# Altium schematic symbol library FPGA_Xilinx_Virtex7.SchLib: 34 symbols (part 15 of 34)
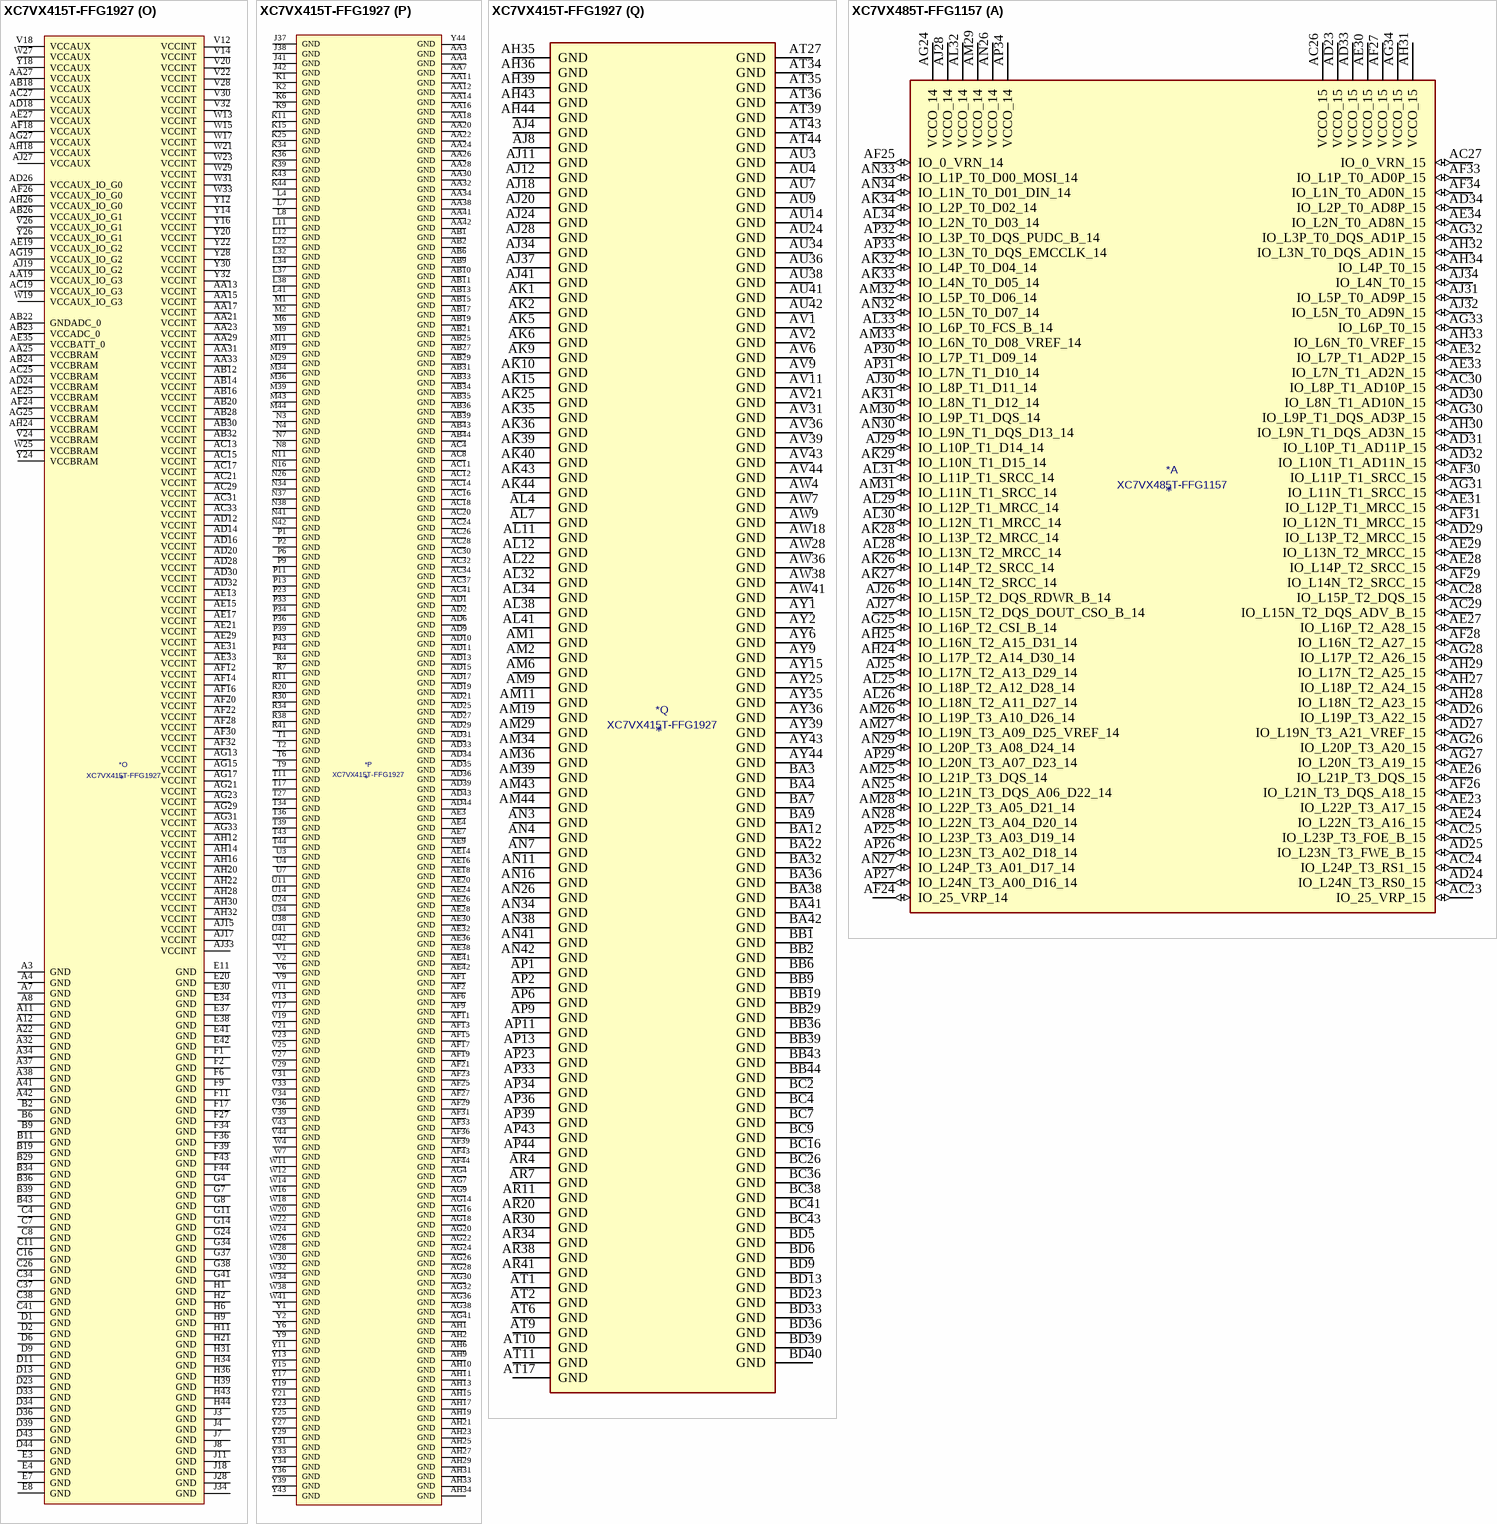
[diagram p186: symbols XC7VX415T-FFG1927 to XC7VX485T-FFG1157]

## XC7VX415T-FFG1927
designator *  value XC7VX415T-FFG1927
ki_keywords: FPGA; ki_description: Virtex 7 XT 415 XC7VX415T-FFG1927
part A pins: AJ23 VCCO_15 (power), AJ25 IO_L24P_T3_RS1_15 (io), AJ26 IO_L24N_T3_RS0_15 (io), AJ29 IO_L23P_T3_A03_D19_14 (io), AK23 IO_L21P_T3_DQS_15 (io), AK24 IO_L21N_T3_DQS_A18_15 (io), AK26 IO_L22P_T3_A17_15 (io), AK27 IO_L21P_T3_DQS_14 (io), AK28 IO_L21N_T3_DQS_A06_D22_14 (io), AK29 IO_L23N_T3_A02_D18_14 (io), AL23 IO_L19P_T3_A22_15 (io), AL24 IO_L23P_T3_FOE_B_15 (io), AL25 IO_L23N_T3_FWE_B_15 (io), AL26 IO_L22N_T3_A16_15 (io), AL27 VCCO_14 (power), AL28 IO_L24P_T3_A01_D17_14 (io), AL29 IO_L24N_T3_A00_D16_14 (io), AM23 IO_L19N_T3_A21_VREF_15 (io), AM24 VCCO_15 (power), AM25 IO_L20P_T3_A20_15 (io), AM26 IO_L20N_T3_A19_15 (io), AM27 IO_L22P_T3_A05_D21_14 (io), AM28 IO_L22N_T3_A04_D20_14 (io), AM30 IO_L20P_T3_A08_D24_14 (io), AN23 IO_L15P_T2_DQS_15 (io), AN24 IO_L15N_T2_DQS_ADV_B_15 (io), AN25 IO_L18P_T2_A24_15 (io), AN27 IO_L15P_T2_DQS_RDWR_B_14 (io), AN28 IO_L19P_T3_A10_D26_14 (io), AN29 IO_L19N_T3_A09_D25_VREF_14 (io), AN30 IO_L20N_T3_A07_D23_14 (io), AP24 IO_L17P_T2_A26_15 (io), AP25 IO_L17N_T2_A25_15 (io), AP26 IO_L18N_T2_A23_15 (io), AP27 IO_L15N_T2_DQS_DOUT_CSO_B_14 (io), AP28 VCCO_14 (power), AP29 IO_L17P_T2_A14_D30_14 (io), AP30 IO_L17N_T2_A13_D29_14 (io), AR24 IO_0_VRN_15 (io), AR25 VCCO_15 (power), AR26 IO_25_VRP_15 (io), AR27 IO_25_VRP_14 (io), AR28 IO_L18P_T2_A12_D28_14 (io), AR29 IO_L18N_T2_A11_D27_14 (io), AT23 IO_L13P_T2_MRCC_15 (io), AT24 IO_L14P_T2_SRCC_15 (io), AT25 IO_L14N_T2_SRCC_15 (io), AT26 IO_L16P_T2_A28_15 (io), AT28 IO_L16P_T2_CSI_B_14 (io), AT29 IO_L16N_T2_A15_D31_14 (io), AT30 IO_0_VRN_14 (io), AU23 IO_L13N_T2_MRCC_15 (io), AU25 IO_L12P_T1_MRCC_15 (io), AU26 IO_L12N_T1_MRCC_15 (io), AU27 IO_L16N_T2_A27_15 (io), AU28 IO_L14P_T2_SRCC_14 (io), AU29 VCCO_14 (power), AU30 IO_L13P_T2_MRCC_14 (io), AV23 IO_L11P_T1_SRCC_15 (io), AV24 IO_L11N_T1_SRCC_15 (io), AV25 IO_L9P_T1_DQS_AD3P_15 (io), AV26 VCCO_15 (power), AV27 IO_L12P_T1_MRCC_14 (io), AV28 IO_L12N_T1_MRCC_14 (io), AV29 IO_L14N_T2_SRCC_14 (io), AV30 IO_L13N_T2_MRCC_14 (io), AW23 VCCO_15 (power), AW24 IO_L10P_T1_AD11P_15 (io), AW25 IO_L9N_T1_DQS_AD3N_15 (io), AW26 IO_L7P_T1_AD2P_15 (io), AW27 IO_L8P_T1_D11_14 (io), AW29 IO_L7P_T1_D09_14 (io), AW30 IO_L11P_T1_SRCC_14 (io), AW31 IO_L11N_T1_SRCC_14 (io), AY23 IO_L8P_T1_AD10P_15 (io), AY24 IO_L10N_T1_AD11N_15 (io), AY26 IO_L7N_T1_AD2N_15 (io), AY27 IO_L8N_T1_D12_14 (io), AY28 IO_L10P_T1_D14_14 (io), AY29 IO_L7N_T1_D10_14 (io), AY30 VCCO_14 (power), AY31 IO_L9P_T1_DQS_14 (io), BA23 IO_L8N_T1_AD10N_15 (io), BA24 IO_L6P_T0_15 (io), BA25 IO_L6N_T0_VREF_15 (io), BA26 IO_L5P_T0_AD9P_15 (io), BA27 VCCO_14 (power), BA28 IO_L10N_T1_D15_14 (io), BA29 IO_L6P_T0_FCS_B_14 (io), BA30 IO_L6N_T0_D08_VREF_14 (io), BA31 IO_L9N_T1_DQS_D13_14 (io), BB23 IO_L2P_T0_AD8P_15 (io), BB24 VCCO_15 (power), BB25 IO_L3P_T0_DQS_AD1P_15 (io), BB26 IO_L5N_T0_AD9N_15 (io), BB27 IO_L3P_T0_DQS_PUDC_B_14 (io), BB28 IO_L3N_T0_DQS_EMCCLK_14 (io), BB30 IO_L4P_T0_D04_14 (io), BC23 IO_L2N_T0_AD8N_15 (io), BC24 IO_L4P_T0_15 (io), BC25 IO_L3N_T0_DQS_AD1N_15 (io), BC27 IO_L1P_T0_D00_MOSI_14 (io), BC28 IO_L5P_T0_D06_14 (io), BC29 IO_L5N_T0_D07_14 (io), BC30 IO_L4N_T0_D05_14 (io), BD24 IO_L4N_T0_15 (io), BD25 IO_L1P_T0_AD0P_15 (io), BD26 IO_L1N_T0_AD0N_15 (io), BD27 IO_L1N_T0_D01_DIN_14 (io), BD28 VCCO_14 (power), BD29 IO_L2P_T0_D02_14 (io), BD30 IO_L2N_T0_D03_14 (io)
part B pins: A23 IO_L1N_T0_17 (io), A24 IO_L4P_T0_17 (io), A25 IO_L4N_T0_17 (io), AJ30 IO_L2P_T0_16 (io), AJ31 IO_L2N_T0_16 (io), AJ32 IO_L4P_T0_16 (io), AK30 VCCO_16 (power), AK31 IO_L3P_T0_DQS_16 (io), AK32 IO_L4N_T0_16 (io), AK33 IO_L1P_T0_16 (io), AL30 IO_L5P_T0_16 (io), AL31 IO_L3N_T0_DQS_16 (io), AL33 IO_L1N_T0_16 (io), AM31 IO_L5N_T0_16 (io), AM32 IO_L6P_T0_16 (io), AM33 IO_L6N_T0_VREF_16 (io), AN31 VCCO_16 (power), AN32 IO_L7P_T1_16 (io), AN33 IO_L7N_T1_16 (io), AP31 IO_L9P_T1_DQS_16 (io), AP32 IO_L9N_T1_DQS_16 (io), AR31 IO_L10P_T1_16 (io), AR32 IO_L10N_T1_16 (io), AR33 IO_L8P_T1_16 (io), AT31 IO_25_VRP_16 (io), AT32 VCCO_16 (power), AT33 IO_L8N_T1_16 (io), AU31 IO_L11P_T1_SRCC_16 (io), AU32 IO_L11N_T1_SRCC_16 (io), AU33 IO_L12P_T1_MRCC_16 (io), AU35 IO_0_VRN_16 (io), AV32 IO_L13P_T2_MRCC_16 (io), AV33 IO_L12N_T1_MRCC_16 (io), AV34 IO_L14P_T2_SRCC_16 (io), AV35 IO_L14N_T2_SRCC_16 (io), AW32 IO_L13N_T2_MRCC_16 (io), AW33 VCCO_16 (power), AW34 IO_L15P_T2_DQS_16 (io), AW35 IO_L15N_T2_DQS_16 (io), AY32 IO_L18P_T2_16 (io), AY33 IO_L16P_T2_16 (io), AY34 IO_L16N_T2_16 (io), B23 IO_L1P_T0_17 (io), B24 VCCO_17 (power), B25 IO_L2N_T0_17 (io), BA33 IO_L18N_T2_16 (io), BA34 IO_L17P_T2_16 (io), BA35 IO_L17N_T2_16 (io), BB31 IO_L19P_T3_16 (io), BB32 IO_L19N_T3_VREF_16 (io), BB33 IO_L22P_T3_16 (io), BB34 VCCO_16 (power), BB35 IO_L20P_T3_16 (io), BC31 VCCO_16 (power), BC32 IO_L21P_T3_DQS_16 (io), BC33 IO_L21N_T3_DQS_16 (io), BC34 IO_L22N_T3_16 (io), BC35 IO_L20N_T3_16 (io), BD31 IO_L23P_T3_16 (io), BD32 IO_L23N_T3_16 (io), BD34 IO_L24P_T3_16 (io), BD35 IO_L24N_T3_16 (io), C23 IO_L3P_T0_DQS_17 (io), C24 IO_L3N_T0_DQS_17 (io), C25 IO_L2P_T0_17 (io), D24 IO_L5P_T0_17 (io), D25 IO_L5N_T0_17 (io), E23 IO_L6P_T0_17 (io), E24 IO_L6N_T0_VREF_17 (io), E25 VCCO_17 (power), F23 IO_L7N_T1_17 (io), F24 IO_L8P_T1_17 (io), F25 IO_L8N_T1_17 (io), G23 IO_L7P_T1_17 (io), G25 IO_L10P_T1_17 (io), G26 IO_L10N_T1_17 (io), H23 IO_L9P_T1_DQS_17 (io), H24 IO_L9N_T1_DQS_17 (io), H25 IO_L11N_T1_SRCC_17 (io), H26 VCCO_17 (power), J23 VCCO_17 (power), J24 IO_L11P_T1_SRCC_17 (io), J25 IO_L12P_T1_MRCC_17 (io), J26 IO_L12N_T1_MRCC_17 (io), K23 IO_L13P_T2_MRCC_17 (io), K24 IO_L13N_T2_MRCC_17 (io), K26 IO_L15N_T2_DQS_17 (io), L23 IO_L18N_T2_17 (io), L24 IO_L14P_T2_SRCC_17 (io), L25 IO_L14N_T2_SRCC_17 (io), L26 IO_L15P_T2_DQS_17 (io), M23 IO_L18P_T2_17 (io), M24 VCCO_17 (power), M25 IO_L17N_T2_17 (io), M26 IO_0_VRN_17 (io), N23 IO_L16P_T2_17 (io), N24 IO_L16N_T2_17 (io), N25 IO_L17P_T2_17 (io), P24 IO_25_VRP_17 (io), P25 IO_L20P_T3_17 (io), P26 IO_L20N_T3_17 (io), R23 IO_L24P_T3_17 (io), R24 IO_L24N_T3_17 (io), R25 VCCO_17 (power), R26 IO_L22N_T3_17 (io), T23 IO_L23N_T3_17 (io), T24 IO_L19P_T3_17 (io), T25 IO_L19N_T3_VREF_17 (io), T26 IO_L22P_T3_17 (io), U23 IO_L23P_T3_17 (io), U25 IO_L21P_T3_DQS_17 (io), U26 IO_L21N_T3_DQS_17 (io)
part C pins: A26 IO_L5N_T0_19 (io), A27 VCCO_19 (power), A28 IO_L1P_T0_19 (io), A29 IO_L1N_T0_19 (io), A30 IO_L3P_T0_DQS_18 (io), A31 IO_L3N_T0_DQS_18 (io), A33 IO_L2N_T0_18 (io), B26 IO_L5P_T0_19 (io), B27 IO_L3N_T0_DQS_19 (io), B28 IO_L4N_T0_19 (io), B30 IO_L1N_T0_18 (io), B31 IO_L5P_T0_18 (io), B32 IO_L5N_T0_18 (io), B33 IO_L2P_T0_18 (io), C27 IO_L3P_T0_DQS_19 (io), C28 IO_L4P_T0_19 (io), C29 IO_L2N_T0_19 (io), C30 IO_L1P_T0_18 (io), C31 VCCO_18 (power), C32 IO_L4P_T0_18 (io), C33 IO_L4N_T0_18 (io), D26 IO_L6P_T0_19 (io), D27 IO_L6N_T0_VREF_19 (io), D28 VCCO_19 (power), D29 IO_L2P_T0_19 (io), D30 IO_L6P_T0_18 (io), D31 IO_L6N_T0_VREF_18 (io), D32 IO_L7N_T1_18 (io), E26 IO_L8N_T1_19 (io), E27 IO_L10P_T1_19 (io), E28 IO_L10N_T1_19 (io), E29 IO_L9N_T1_DQS_19 (io), E31 IO_L7P_T1_18 (io), E32 IO_L8P_T1_18 (io), E33 IO_L8N_T1_18 (io), F26 IO_L8P_T1_19 (io), F28 IO_L7N_T1_19 (io), F29 IO_L9P_T1_DQS_19 (io), F30 IO_L9P_T1_DQS_18 (io), F31 IO_L9N_T1_DQS_18 (io), F32 VCCO_18 (power), F33 IO_L10N_T1_18 (io), G27 IO_L11N_T1_SRCC_19 (io), G28 IO_L7P_T1_19 (io), G29 VCCO_19 (power), G30 IO_L12N_T1_MRCC_18 (io), G31 IO_L11P_T1_SRCC_18 (io), G32 IO_L11N_T1_SRCC_18 (io), G33 IO_L10P_T1_18 (io), H27 IO_L11P_T1_SRCC_19 (io), H28 IO_L12P_T1_MRCC_19 (io), H29 IO_L12N_T1_MRCC_19 (io), H30 IO_L12P_T1_MRCC_18 (io), H32 IO_L13P_T2_MRCC_18 (io), H33 IO_L13N_T2_MRCC_18 (io), J27 IO_L13N_T2_MRCC_19 (io), J29 IO_L14N_T2_SRCC_19 (io), J30 IO_L14P_T2_SRCC_18 (io), J31 IO_L14N_T2_SRCC_18 (io), J32 IO_L16N_T2_18 (io), J33 VCCO_18 (power), K27 IO_L13P_T2_MRCC_19 (io), K28 IO_L14P_T2_SRCC_19 (io), K29 IO_L16N_T2_19 (io), K30 VCCO_18 (power), K31 IO_L15N_T2_DQS_18 (io), K32 IO_L16P_T2_18 (io), K33 IO_L18N_T2_18 (io), L27 VCCO_19 (power), L28 IO_L16P_T2_19 (io), L29 IO_L18N_T2_19 (io), L30 IO_0_VRN_18 (io), L31 IO_L15P_T2_DQS_18 (io), L33 IO_L18P_T2_18 (io), M27 IO_0_VRN_19 (io), M28 IO_L18P_T2_19 (io), M30 IO_L15N_T2_DQS_19 (io), M31 IO_L17P_T2_18 (io), M32 IO_L17N_T2_18 (io), M33 IO_L20N_T3_18 (io), N27 IO_25_VRP_19 (io), N28 IO_L17P_T2_19 (io), N29 IO_L17N_T2_19 (io), N30 IO_L15P_T2_DQS_19 (io), N31 VCCO_18 (power), N32 IO_L22N_T3_18 (io), N33 IO_L20P_T3_18 (io), P27 IO_L23N_T3_19 (io), P28 VCCO_19 (power), P29 IO_L19P_T3_19 (io), P30 IO_L19N_T3_VREF_19 (io), P31 IO_L22P_T3_18 (io), P32 IO_L19N_T3_VREF_18 (io), R27 IO_L23P_T3_19 (io), R28 IO_L21P_T3_DQS_19 (io), R29 IO_L21N_T3_DQS_19 (io), R31 IO_L21N_T3_DQS_18 (io), R32 IO_L19P_T3_18 (io), R33 IO_L24N_T3_18 (io), T28 IO_L20P_T3_19 (io), T29 IO_L20N_T3_19 (io), T30 IO_L22N_T3_19 (io), T31 IO_L21P_T3_DQS_18 (io), T32 VCCO_18 (power), T33 IO_L24P_T3_18 (io), U27 IO_L24P_T3_19 (io), U28 IO_L24N_T3_19 (io), U29 VCCO_19 (power), U30 IO_L22P_T3_19 (io), U31 IO_25_VRP_18 (io), U32 IO_L23P_T3_18 (io), U33 IO_L23N_T3_18 (io)
part D pins: AJ16 IO_L23P_T3_34 (io), AJ21 IO_L20N_T3_35 (io), AJ22 IO_L20P_T3_35 (io), AK16 IO_L23N_T3_34 (io), AK17 IO_25_VRP_34 (io), AK18 IO_L21P_T3_DQS_34 (io), AK19 IO_L24P_T3_35 (io), AK20 VCCO_35 (power), AK21 IO_L22N_T3_35 (io), AK22 IO_L22P_T3_35 (io), AL15 IO_L24N_T3_34 (io), AL16 IO_L24P_T3_34 (io), AL17 VCCO_34 (power), AL18 IO_L21N_T3_DQS_34 (io), AL19 IO_L24N_T3_35 (io), AL20 IO_L23N_T3_35 (io), AL21 IO_L23P_T3_35 (io), AM15 IO_L20P_T3_34 (io), AM16 IO_L22N_T3_34 (io), AM17 IO_L22P_T3_34 (io), AM18 IO_L19P_T3_34 (io), AM20 IO_L21P_T3_DQS_35 (io), AM21 IO_L19N_T3_VREF_35 (io), AM22 IO_L19P_T3_35 (io), AN15 IO_L20N_T3_34 (io), AN17 IO_L18P_T2_34 (io), AN18 IO_L19N_T3_VREF_34 (io), AN19 IO_L21N_T3_DQS_35 (io), AN20 IO_L17P_T2_35 (io), AN21 VCCO_35 (power), AN22 IO_L18P_T2_35 (io), AP15 IO_0_VRN_34 (io), AP16 IO_L15P_T2_DQS_34 (io), AP17 IO_L18N_T2_34 (io), AP18 VCCO_34 (power), AP19 IO_L17N_T2_35 (io), AP20 IO_L15N_T2_DQS_35 (io), AP21 IO_L15P_T2_DQS_35 (io), AP22 IO_L18N_T2_35 (io), AR15 VCCO_34 (power), AR16 IO_L15N_T2_DQS_34 (io), AR17 IO_L16N_T2_34 (io), AR18 IO_L16P_T2_34 (io), AR19 IO_25_VRP_35 (io), AR21 IO_L16N_T2_35 (io), AR22 IO_L16P_T2_35 (io), AR23 IO_0_VRN_35 (io), AT15 IO_L17N_T2_34 (io), AT16 IO_L17P_T2_34 (io), AT18 IO_L13P_T2_MRCC_34 (io), AT19 IO_L14N_T2_SRCC_35 (io), AT20 IO_L14P_T2_SRCC_35 (io), AT21 IO_L13P_T2_MRCC_35 (io), AT22 VCCO_35 (power), AU15 IO_L12P_T1_MRCC_34 (io), AU16 IO_L14N_T2_SRCC_34 (io), AU17 IO_L14P_T2_SRCC_34 (io), AU18 IO_L13N_T2_MRCC_34 (io), AU19 VCCO_35 (power), AU20 IO_L12P_T1_MRCC_35 (io), AU21 IO_L13N_T2_MRCC_35 (io), AU22 IO_L11P_T1_SRCC_35 (io), AV15 IO_L12N_T1_MRCC_34 (io), AV16 VCCO_34 (power), AV17 IO_L11N_T1_SRCC_34 (io), AV18 IO_L11P_T1_SRCC_34 (io), AV19 IO_L12N_T1_MRCC_35 (io), AV20 IO_L8P_T1_AD14P_35 (io), AV22 IO_L11N_T1_SRCC_35 (io), AW15 IO_L9N_T1_DQS_34 (io), AW16 IO_L9P_T1_DQS_34 (io), AW17 IO_L7P_T1_34 (io), AW19 IO_L10P_T1_AD15P_35 (io), AW20 IO_L8N_T1_AD14N_35 (io), AW21 IO_L9P_T1_DQS_AD7P_35 (io), AW22 IO_L7P_T1_AD6P_35 (io), AY16 IO_L7N_T1_34 (io), AY17 IO_L8N_T1_34 (io), AY18 IO_L8P_T1_34 (io), AY19 IO_L10N_T1_AD15N_35 (io), AY20 VCCO_35 (power), AY21 IO_L9N_T1_DQS_AD7N_35 (io), AY22 IO_L7N_T1_AD6N_35 (io), BA15 IO_L10N_T1_34 (io), BA16 IO_L10P_T1_34 (io), BA17 VCCO_34 (power), BA18 IO_L1P_T0_34 (io), BA19 IO_L6N_T0_VREF_35 (io), BA20 IO_L6P_T0_35 (io), BA21 IO_L5P_T0_AD13P_35 (io), BB15 IO_L6N_T0_VREF_34 (io), BB16 IO_L6P_T0_34 (io), BB17 IO_L3P_T0_DQS_34 (io), BB18 IO_L1N_T0_34 (io), BB20 IO_L5N_T0_AD13N_35 (io), BB21 IO_L1N_T0_AD4N_35 (io), BB22 IO_L1P_T0_AD4P_35 (io), BC15 IO_L5P_T0_34 (io), BC17 IO_L3N_T0_DQS_34 (io), BC18 IO_L2N_T0_34 (io), BC19 IO_L2P_T0_34 (io), BC20 IO_L3P_T0_DQS_AD5P_35 (io), BC21 VCCO_35 (power), BC22 IO_L2P_T0_AD12P_35 (io), BD15 IO_L5N_T0_34 (io), BD16 IO_L4N_T0_34 (io), BD17 IO_L4P_T0_34 (io), BD18 VCCO_34 (power), BD19 IO_L3N_T0_DQS_AD5N_35 (io), BD20 IO_L4N_T0_35 (io), BD21 IO_L4P_T0_35 (io), BD22 IO_L2N_T0_AD12N_35 (io)
part E pins: A20 IO_L2N_T0_37 (io), A21 IO_L1N_T0_37 (io), AJ13 VCCO_36 (power), AJ14 IO_L1P_T0_36 (io), AK12 IO_L3N_T0_DQS_36 (io), AK13 IO_L3P_T0_DQS_36 (io), AK14 IO_L1N_T0_36 (io), AL13 IO_L5N_T0_36 (io), AL14 IO_L5P_T0_36 (io), AM12 IO_L2N_T0_36 (io), AM13 IO_L2P_T0_36 (io), AM14 VCCO_36 (power), AN12 IO_L4N_T0_36 (io), AN13 IO_L4P_T0_36 (io), AN14 IO_L6P_T0_36 (io), AP12 IO_0_VRN_36 (io), AP14 IO_L6N_T0_VREF_36 (io), AR12 IO_L7N_T1_36 (io), AR13 IO_L7P_T1_36 (io), AR14 IO_25_VRP_36 (io), AT12 VCCO_36 (power), AT13 IO_L9N_T1_DQS_36 (io), AT14 IO_L9P_T1_DQS_36 (io), AU10 IO_L10P_T1_36 (io), AU11 IO_L8N_T1_36 (io), AU12 IO_L8P_T1_36 (io), AU13 IO_L12P_T1_MRCC_36 (io), AV10 IO_L10N_T1_36 (io), AV12 IO_L11P_T1_SRCC_36 (io), AV13 IO_L12N_T1_MRCC_36 (io), AV14 IO_L13P_T2_MRCC_36 (io), AW10 IO_L14N_T2_SRCC_36 (io), AW11 IO_L14P_T2_SRCC_36 (io), AW12 IO_L11N_T1_SRCC_36 (io), AW13 VCCO_36 (power), AW14 IO_L13N_T2_MRCC_36 (io), AY10 VCCO_36 (power), AY11 IO_L16N_T2_36 (io), AY12 IO_L16P_T2_36 (io), AY13 IO_L15P_T2_DQS_36 (io), AY14 IO_L18P_T2_36 (io), B20 IO_L2P_T0_37 (io), B21 IO_L1P_T0_37 (io), B22 IO_L3N_T0_DQS_37 (io), BA10 IO_L17N_T2_36 (io), BA11 IO_L17P_T2_36 (io), BA13 IO_L15N_T2_DQS_36 (io), BA14 IO_L18N_T2_36 (io), BB10 IO_L19N_T3_VREF_36 (io), BB11 IO_L19P_T3_36 (io), BB12 IO_L20P_T3_36 (io), BB13 IO_L22P_T3_36 (io), BB14 VCCO_36 (power), BC10 IO_L24P_T3_36 (io), BC11 VCCO_36 (power), BC12 IO_L20N_T3_36 (io), BC13 IO_L22N_T3_36 (io), BC14 IO_L23P_T3_36 (io), BD10 IO_L24N_T3_36 (io), BD11 IO_L21N_T3_DQS_36 (io), BD12 IO_L21P_T3_DQS_36 (io), BD14 IO_L23N_T3_36 (io), C20 IO_L4N_T0_37 (io), C21 VCCO_37 (power), C22 IO_L3P_T0_DQS_37 (io), D20 IO_L4P_T0_37 (io), D21 IO_L5N_T0_37 (io), D22 IO_L5P_T0_37 (io), E21 IO_L6N_T0_VREF_37 (io), E22 IO_L6P_T0_37 (io), F19 IO_L8N_T1_37 (io), F20 IO_L8P_T1_37 (io), F21 IO_L7N_T1_37 (io), F22 VCCO_37 (power), G19 VCCO_37 (power), G20 IO_L12N_T1_MRCC_37 (io), G21 IO_L7P_T1_37 (io), G22 IO_L9N_T1_DQS_37 (io), H19 IO_L10N_T1_37 (io), H20 IO_L12P_T1_MRCC_37 (io), H22 IO_L9P_T1_DQS_37 (io), J19 IO_L10P_T1_37 (io), J20 IO_L11N_T1_SRCC_37 (io), J21 IO_L11P_T1_SRCC_37 (io), J22 IO_L13N_T2_MRCC_37 (io), K19 IO_L15N_T2_DQS_37 (io), K20 VCCO_37 (power), K21 IO_L14N_T2_SRCC_37 (io), K22 IO_L13P_T2_MRCC_37 (io), L19 IO_L15P_T2_DQS_37 (io), L20 IO_L16N_T2_37 (io), L21 IO_L14P_T2_SRCC_37 (io), M20 IO_L16P_T2_37 (io), M21 IO_25_VRP_37 (io), M22 IO_L18N_T2_37 (io), N19 IO_L17N_T2_37 (io), N20 IO_L17P_T2_37 (io), N21 VCCO_37 (power), N22 IO_L18P_T2_37 (io), P19 IO_0_VRN_37 (io), P20 IO_L22N_T3_37 (io), P21 IO_L22P_T3_37 (io), P22 IO_L23N_T3_37 (io), R19 IO_L20N_T3_37 (io), R21 IO_L24N_T3_37 (io), R22 IO_L23P_T3_37 (io), T19 IO_L20P_T3_37 (io), T20 IO_L19N_T3_VREF_37 (io), T21 IO_L24P_T3_37 (io), T22 VCCO_37 (power), U19 VCCO_37 (power), U20 IO_L19P_T3_37 (io), U21 IO_L21N_T3_DQS_37 (io), U22 IO_L21P_T3_DQS_37 (io)
part F pins: A13 IO_L4N_T0_38 (io), A14 IO_L4P_T0_38 (io), A15 IO_L2N_T0_38 (io), A16 IO_L2N_T0_39 (io), A17 VCCO_39 (power), A18 IO_L5N_T0_39 (io), A19 IO_L5P_T0_39 (io), B12 IO_L3N_T0_DQS_38 (io), B13 IO_L3P_T0_DQS_38 (io), B14 VCCO_38 (power), B15 IO_L2P_T0_38 (io), B16 IO_L2P_T0_39 (io), B17 IO_L4N_T0_39 (io), B18 IO_L1N_T0_39 (io), C12 IO_L5N_T0_38 (io), C13 IO_L5P_T0_38 (io), C14 IO_L1N_T0_38 (io), C15 IO_L1P_T0_38 (io), C17 IO_L4P_T0_39 (io), C18 IO_L1P_T0_39 (io), C19 IO_L3N_T0_DQS_39 (io), D12 IO_L7N_T1_38 (io), D14 IO_L6N_T0_VREF_38 (io), D15 IO_L6P_T0_38 (io), D16 IO_L6N_T0_VREF_39 (io), D17 IO_L6P_T0_39 (io), D18 VCCO_39 (power), D19 IO_L3P_T0_DQS_39 (io), E12 IO_L7P_T1_38 (io), E13 IO_L8N_T1_38 (io), E14 IO_L8P_T1_38 (io), E15 VCCO_38 (power), E16 IO_L7N_T1_39 (io), E17 IO_L7P_T1_39 (io), E18 IO_L10N_T1_39 (io), E19 IO_L10P_T1_39 (io), F12 VCCO_38 (power), F13 IO_L10N_T1_38 (io), F14 IO_L10P_T1_38 (io), F15 IO_L9N_T1_DQS_38 (io), F16 IO_L9N_T1_DQS_39 (io), F18 IO_L8N_T1_39 (io), G12 IO_L15N_T2_DQS_38 (io), G13 IO_L11N_T1_SRCC_38 (io), G15 IO_L9P_T1_DQS_38 (io), G16 IO_L9P_T1_DQS_39 (io), G17 IO_L12N_T1_MRCC_39 (io), G18 IO_L8P_T1_39 (io), H12 IO_L15P_T2_DQS_38 (io), H13 IO_L11P_T1_SRCC_38 (io), H14 IO_L12N_T1_MRCC_38 (io), H15 IO_L12P_T1_MRCC_38 (io), H16 VCCO_39 (power), H17 IO_L11N_T1_SRCC_39 (io), H18 IO_L12P_T1_MRCC_39 (io), J12 IO_L18N_T2_38 (io), J13 VCCO_38 (power), J14 IO_L13N_T2_MRCC_38 (io), J15 IO_L13P_T2_MRCC_38 (io), J16 IO_L13N_T2_MRCC_39 (io), J17 IO_L11P_T1_SRCC_39 (io), K12 IO_L18P_T2_38 (io), K13 IO_L14N_T2_SRCC_38 (io), K14 IO_L14P_T2_SRCC_38 (io), K16 IO_L14N_T2_SRCC_39 (io), K17 IO_L13P_T2_MRCC_39 (io), K18 IO_0_VRN_39 (io), L13 IO_L16N_T2_38 (io), L14 IO_L17N_T2_38 (io), L15 IO_0_VRN_38 (io), L16 IO_L14P_T2_SRCC_39 (io), L17 VCCO_39 (power), L18 IO_L16N_T2_39 (io), M12 IO_L22N_T3_38 (io), M13 IO_L16P_T2_38 (io), M14 VCCO_38 (power), M15 IO_L17P_T2_38 (io), M16 IO_L18N_T2_39 (io), M17 IO_L18P_T2_39 (io), M18 IO_L16P_T2_39 (io), N12 IO_L22P_T3_38 (io), N13 IO_L20N_T3_38 (io), N14 IO_L20P_T3_38 (io), N15 IO_L17N_T2_39 (io), N17 IO_L15N_T2_DQS_39 (io), N18 IO_25_VRP_39 (io), P12 IO_L24N_T3_38 (io), P14 IO_L19N_T3_VREF_38 (io), P15 IO_L17P_T2_39 (io), P16 IO_L20N_T3_39 (io), P17 IO_L15P_T2_DQS_39 (io), P18 VCCO_39 (power), R12 IO_L24P_T3_38 (io), R13 IO_L21N_T3_DQS_38 (io), R14 IO_L19P_T3_38 (io), R15 VCCO_39 (power), R16 IO_L20P_T3_39 (io), R17 IO_L22N_T3_39 (io), R18 IO_L22P_T3_39 (io), T12 VCCO_38 (power), T13 IO_L23N_T3_38 (io), T14 IO_L21P_T3_DQS_38 (io), T15 IO_L19N_T3_VREF_39 (io), T16 IO_L19P_T3_39 (io), T18 IO_L23N_T3_39 (io), U12 IO_25_VRP_38 (io), U13 IO_L23P_T3_38 (io), U15 IO_L24N_T3_39 (io), U16 IO_L21N_T3_DQS_39 (io), U17 IO_L21P_T3_DQS_39 (io), U18 IO_L23P_T3_39 (io), V15 IO_L24P_T3_39 (io), V16 VCCO_39 (power)
part G pins: AA1 MGTHTXN1_115 (io), AA2 MGTHTXP1_115 (io), AA5 MGTHRXN2_114 (io), AA6 MGTHRXP2_114 (io), AA9 MGTREFCLK0N_114 (io), AA10 MGTREFCLK0P_114 (io), AB3 MGTHTXN0_115 (io), AB4 MGTHTXP0_115 (io), AB7 MGTREFCLK1N_114 (io), AB8 MGTREFCLK1P_114 (io), AC1 MGTHTXN3_114 (io), AC2 MGTHTXP3_114 (io), AC5 MGTHRXN1_114 (io), AC6 MGTHRXP1_114 (io), AD3 MGTHTXN2_114 (io), AD4 MGTHTXP2_114 (io), AD7 MGTHRXN0_114 (io), AD8 MGTHRXP0_114 (io), AE1 MGTHTXN1_114 (io), AE2 MGTHTXP1_114 (io), AF3 MGTHTXN0_114 (io), AF4 MGTHTXP0_114 (io), T7 MGTHRXN3_115 (io), T8 MGTHRXP3_115 (io), U5 MGTHRXN2_115 (io), U6 MGTHRXP2_115 (io), U9 MGTREFCLK0N_115 (io), U10 MGTREFCLK0P_115 (io), V7 MGTHRXN1_115 (io), V8 MGTHRXP1_115 (io), W1 MGTHTXN3_115 (io), W2 MGTHTXP3_115 (io), W5 MGTHRXN0_115 (io), W6 MGTHRXP0_115 (io), W9 MGTREFCLK1N_115 (io), W10 MGTREFCLK1P_115 (io), Y3 MGTHTXN2_115 (io), Y4 MGTHTXP2_115 (io), Y7 MGTHRXN3_114 (io), Y8 MGTHRXP3_114 (io)
part H pins: H7 MGTHRXN3_117 (io), H8 MGTHRXP3_117 (io), J5 MGTHRXN2_117 (io), J6 MGTHRXP2_117 (io), J9 MGTREFCLK0N_117 (io), J10 MGTREFCLK0P_117 (io), K7 MGTHRXN1_117 (io), K8 MGTHRXP1_117 (io), L1 MGTHTXN3_117 (io), L2 MGTHTXP3_117 (io), L5 MGTHRXN0_117 (io), L6 MGTHRXP0_117 (io), L9 MGTREFCLK1N_117 (io), L10 MGTREFCLK1P_117 (io), M3 MGTHTXN2_117 (io), M4 MGTHTXP2_117 (io), M7 MGTHRXN3_116 (io), M8 MGTHRXP3_116 (io), N1 MGTHTXN1_117 (io), N2 MGTHTXP1_117 (io), N5 MGTHRXN2_116 (io), N6 MGTHRXP2_116 (io), N9 MGTREFCLK0N_116 (io), N10 MGTREFCLK0P_116 (io), P3 MGTHTXN0_117 (io), P4 MGTHTXP0_117 (io), P7 MGTHRXN1_116 (io), P8 MGTHRXP1_116 (io), R1 MGTHTXN3_116 (io), R2 MGTHTXP3_116 (io), R5 MGTHRXN0_116 (io), R6 MGTHRXP0_116 (io), R9 MGTREFCLK1N_116 (io), R10 MGTREFCLK1P_116 (io), T3 MGTHTXN2_116 (io), T4 MGTHTXP2_116 (io), U1 MGTHTXN1_116 (io), U2 MGTHTXP1_116 (io), V3 MGTHTXN0_116 (io), V4 MGTHTXP0_116 (io)
part I pins: A5 MGTHRXN3_119 (io), A6 MGTHRXP3_119 (io), A9 MGTREFCLK0N_119 (io), A10 MGTREFCLK0P_119 (io), B3 MGTHTXN3_119 (io), B4 MGTHTXP3_119 (io), B7 MGTHRXN2_119 (io), B8 MGTHRXP2_119 (io), C1 MGTHTXN2_119 (io), C2 MGTHTXP2_119 (io), C5 MGTHRXN1_119 (io), C6 MGTHRXP1_119 (io), C9 MGTREFCLK1N_119 (io), C10 MGTREFCLK1P_119 (io), D3 MGTHRXN0_119 (io), D4 MGTHRXP0_119 (io), D7 MGTHRXN3_118 (io), D8 MGTHRXP3_118 (io), E1 MGTHTXN1_119 (io), E2 MGTHTXP1_119 (io), E5 MGTHRXN2_118 (io), E6 MGTHRXP2_118 (io), E9 MGTREFCLK0N_118 (io), E10 MGTREFCLK0P_118 (io), F3 MGTHTXN0_119 (io), F4 MGTHTXP0_119 (io), F7 MGTHRXN1_118 (io), F8 MGTHRXP1_118 (io), G1 MGTHTXN3_118 (io), G2 MGTHTXP3_118 (io), G5 MGTHRXN0_118 (io), G6 MGTHRXP0_118 (io), G9 MGTREFCLK1N_118 (io), G10 MGTREFCLK1P_118 (io), H3 MGTHTXN2_118 (io), H4 MGTHTXP2_118 (io), J1 MGTHTXN1_118 (io), J2 MGTHTXP1_118 (io), K3 MGTHTXN0_118 (io), K4 MGTHTXP0_118 (io)
part J pins: AA35 MGTREFCLK0P_214 (io), AA36 MGTREFCLK0N_214 (io), AA39 MGTHRXP2_214 (io), AA40 MGTHRXN2_214 (io), AA43 MGTHTXP1_215 (io), AA44 MGTHTXN1_215 (io), AB37 MGTREFCLK1P_214 (io), AB38 MGTREFCLK1N_214 (io), AB41 MGTHTXP0_215 (io), AB42 MGTHTXN0_215 (io), AC39 MGTHRXP1_214 (io), AC40 MGTHRXN1_214 (io), AC43 MGTHTXP3_214 (io), AC44 MGTHTXN3_214 (io), AD37 MGTHRXP0_214 (io), AD38 MGTHRXN0_214 (io), AD41 MGTHTXP2_214 (io), AD42 MGTHTXN2_214 (io), AE43 MGTHTXP1_214 (io), AE44 MGTHTXN1_214 (io), AF41 MGTHTXP0_214 (io), AF42 MGTHTXN0_214 (io), T37 MGTHRXP3_215 (io), T38 MGTHRXN3_215 (io), U35 MGTREFCLK0P_215 (io), U36 MGTREFCLK0N_215 (io), U39 MGTHRXP2_215 (io), U40 MGTHRXN2_215 (io), V37 MGTHRXP1_215 (io), V38 MGTHRXN1_215 (io), W35 MGTREFCLK1P_215 (io), W36 MGTREFCLK1N_215 (io), W39 MGTHRXP0_215 (io), W40 MGTHRXN0_215 (io), W43 MGTHTXP3_215 (io), W44 MGTHTXN3_215 (io), Y37 MGTHRXP3_214 (io), Y38 MGTHRXN3_214 (io), Y41 MGTHTXP2_215 (io), Y42 MGTHTXN2_215 (io)
part K pins: H37 MGTHRXP3_217 (io), H38 MGTHRXN3_217 (io), J35 MGTREFCLK0P_217 (io), J36 MGTREFCLK0N_217 (io), J39 MGTHRXP2_217 (io), J40 MGTHRXN2_217 (io), K37 MGTHRXP1_217 (io), K38 MGTHRXN1_217 (io), L35 MGTREFCLK1P_217 (io), L36 MGTREFCLK1N_217 (io), L39 MGTHRXP0_217 (io), L40 MGTHRXN0_217 (io), L43 MGTHTXP3_217 (io), L44 MGTHTXN3_217 (io), M37 MGTHRXP3_216 (io), M38 MGTHRXN3_216 (io), M41 MGTHTXP2_217 (io), M42 MGTHTXN2_217 (io), N35 MGTREFCLK0P_216 (io), N36 MGTREFCLK0N_216 (io), N39 MGTHRXP2_216 (io), N40 MGTHRXN2_216 (io), N43 MGTHTXP1_217 (io), N44 MGTHTXN1_217 (io), P37 MGTHRXP1_216 (io), P38 MGTHRXN1_216 (io), P41 MGTHTXP0_217 (io), P42 MGTHTXN0_217 (io), R35 MGTREFCLK1P_216 (io), R36 MGTREFCLK1N_216 (io), R39 MGTHRXP0_216 (io), R40 MGTHRXN0_216 (io), R43 MGTHTXP3_216 (io), R44 MGTHTXN3_216 (io), T41 MGTHTXP2_216 (io), T42 MGTHTXN2_216 (io), U43 MGTHTXP1_216 (io), U44 MGTHTXN1_216 (io), V41 MGTHTXP0_216 (io), V42 MGTHTXN0_216 (io)
part L pins: A35 MGTREFCLK0P_219 (io), A36 MGTREFCLK0N_219 (io), A39 MGTHRXP3_219 (io), A40 MGTHRXN3_219 (io), B37 MGTHRXP2_219 (io), B38 MGTHRXN2_219 (io), B41 MGTHTXP3_219 (io), B42 MGTHTXN3_219 (io), C35 MGTREFCLK1P_219 (io), C36 MGTREFCLK1N_219 (io), C39 MGTHRXP1_219 (io), C40 MGTHRXN1_219 (io), C43 MGTHTXP2_219 (io), C44 MGTHTXN2_219 (io), D37 MGTHRXP3_218 (io), D38 MGTHRXN3_218 (io), D41 MGTHRXP0_219 (io), D42 MGTHRXN0_219 (io), E35 MGTREFCLK0P_218 (io), E36 MGTREFCLK0N_218 (io), E39 MGTHRXP2_218 (io), E40 MGTHRXN2_218 (io), E43 MGTHTXP1_219 (io), E44 MGTHTXN1_219 (io), F37 MGTHRXP1_218 (io), F38 MGTHRXN1_218 (io), F41 MGTHTXP0_219 (io), F42 MGTHTXN0_219 (io), G35 MGTREFCLK1P_218 (io), G36 MGTREFCLK1N_218 (io), G39 MGTHRXP0_218 (io), G40 MGTHRXN0_218 (io), G43 MGTHTXP3_218 (io), G44 MGTHTXN3_218 (io), H41 MGTHTXP2_218 (io), H42 MGTHTXN2_218 (io), J43 MGTHTXP1_218 (io), J44 MGTHTXN1_218 (io), K41 MGTHTXP0_218 (io), K42 MGTHTXN0_218 (io)
part M pins: AA8 MGTAVCC_G10 (power), AA37 MGTAVCC_G20 (power), AB5 MGTAVTT_G10 (power), AB40 MGTAVTT_G20 (power), AC3 MGTAVTT_G10 (power), AC7 MGTAVCC_G10 (power), AC9 MGTRREF_115 (power), AC10 MGTAVTTRCAL_115 (power), AC35 MGTRREF_215 (power), AC36 MGTAVTTRCAL_215 (power), AC38 MGTAVCC_G20 (power), AC42 MGTAVTT_G20 (power), AD5 MGTAVTT_G10 (power), AD40 MGTAVTT_G20 (power), AE8 MGTAVCC_G10 (power), AE37 MGTAVCC_G20 (power), AF5 MGTAVTT_G10 (power), AF40 MGTAVTT_G20 (power), AG3 MGTAVTT_G10 (power), AG8 MGTAVCC_G10 (power), AG37 MGTAVCC_G20 (power), AG42 MGTAVTT_G20 (power), AH5 MGTAVTT_G10 (power), AH40 MGTAVTT_G20 (power), AJ3 MGTAVTT_G10 (power), AJ7 MGTAVCC_G10 (power), AJ38 MGTAVCC_G20 (power), AJ42 MGTAVTT_G20 (power), AL3 MGTAVTT_G9 (power), AL8 MGTAVCC_G9 (power), AL37 MGTAVCC_G19 (power), AL42 MGTAVTT_G19 (power), AM5 MGTAVTT_G9 (power), AM10 MGTVCCAUX_G9 (power), AM35 MGTVCCAUX_G19 (power), AM40 MGTAVTT_G19 (power), AN8 MGTAVCC_G9 (power), AN37 MGTAVCC_G19 (power), AP5 MGTAVTT_G9 (power), AP10 MGTAVCC_G9 (power), AP35 MGTAVCC_G19 (power), AP40 MGTAVTT_G19 (power), AR3 MGTAVTT_G9 (power), AR8 MGTAVCC_G9 (power), AR37 MGTAVCC_G19 (power), AR42 MGTAVTT_G19 (power), AT5 MGTAVTT_G9 (power), AT40 MGTAVTT_G19 (power), AU8 MGTAVCC_G9 (power), AU37 MGTAVCC_G19 (power), AV5 MGTAVTT_G9 (power), AV40 MGTAVTT_G19 (power), AW3 MGTAVTT_G9 (power), AW8 MGTAVCC_G9 (power), AW37 MGTAVCC_G19 (power), AW42 MGTAVTT_G19 (power), AY5 MGTAVTT_G9 (power), AY40 MGTAVTT_G19 (power), B5 MGTAVTT_G11 (power), B10 MGTAVCC_G11 (power), B35 MGTAVCC_G21 (power), B40 MGTAVTT_G21 (power), BA8 MGTAVCC_G9 (power), BA37 MGTAVCC_G19 (power), BB5 MGTAVTT_G9 (power), BB40 MGTAVTT_G19 (power), BC3 MGTAVTT_G9 (power), BC8 MGTAVCC_G9 (power), BC37 MGTAVCC_G19 (power), BC42 MGTAVTT_G19 (power), C3 MGTAVTT_G11 (power), C42 MGTAVTT_G21 (power), D5 MGTAVTT_G11 (power), D10 MGTAVCC_G11 (power), D35 MGTAVCC_G21 (power), D40 MGTAVTT_G21 (power), F5 MGTAVTT_G11 (power), F10 MGTAVCC_G11 (power), F35 MGTAVCC_G21 (power), F40 MGTAVTT_G21 (power), G3 MGTAVTT_G11 (power), G42 MGTAVTT_G21 (power), H5 MGTAVTT_G11 (power), H10 MGTAVCC_G11 (power), H35 MGTAVCC_G21 (power), H40 MGTAVTT_G21 (power), K5 MGTAVTT_G11 (power), K10 MGTAVCC_G11 (power), K35 MGTAVCC_G21 (power), K40 MGTAVTT_G21 (power), L3 MGTAVTT_G11 (power), L42 MGTAVTT_G21 (power), M5 MGTAVTT_G11 (power), M10 MGTAVCC_G11 (power), M35 MGTAVCC_G21 (power), M40 MGTAVTT_G21 (power), P5 MGTAVTT_G11 (power), P10 MGTVCCAUX_G11 (power), P35 MGTVCCAUX_G21 (power), P40 MGTAVTT_G21 (power), R3 MGTAVTT_G10 (power), R8 MGTAVCC_G10 (power), R37 MGTAVCC_G20 (power), R42 MGTAVTT_G20 (power), T5 MGTAVTT_G10 (power), T10 MGTVCCAUX_G10 (power), T35 MGTVCCAUX_G20 (power), T40 MGTAVTT_G20 (power), U8 MGTAVCC_G10 (power), U37 MGTAVCC_G20 (power), V5 MGTAVTT_G10 (power), V10 MGTVCCAUX_G10 (power), V35 MGTVCCAUX_G20 (power), V40 MGTAVTT_G20 (power), W3 MGTAVTT_G10 (power), W8 MGTAVCC_G10 (power), W37 MGTAVCC_G20 (power), W42 MGTAVTT_G20 (power), Y5 MGTAVTT_G10 (power), Y10 MGTAVCC_G10 (power), Y35 MGTAVCC_G20 (power), Y40 MGTAVTT_G20 (power)